# Altium footprint library Samtec.PcbLib: 8 footprints
Each footprint in its own frame and in the unit in brackets; x right, y up, seen from the top. Pads: shape width x height; smd on the part's side, far side on the other; paste and mask are expansions set on the pad; w line width, h text height; cw(c..) or ccw(c..) is an arc to the next point about the centre after c.
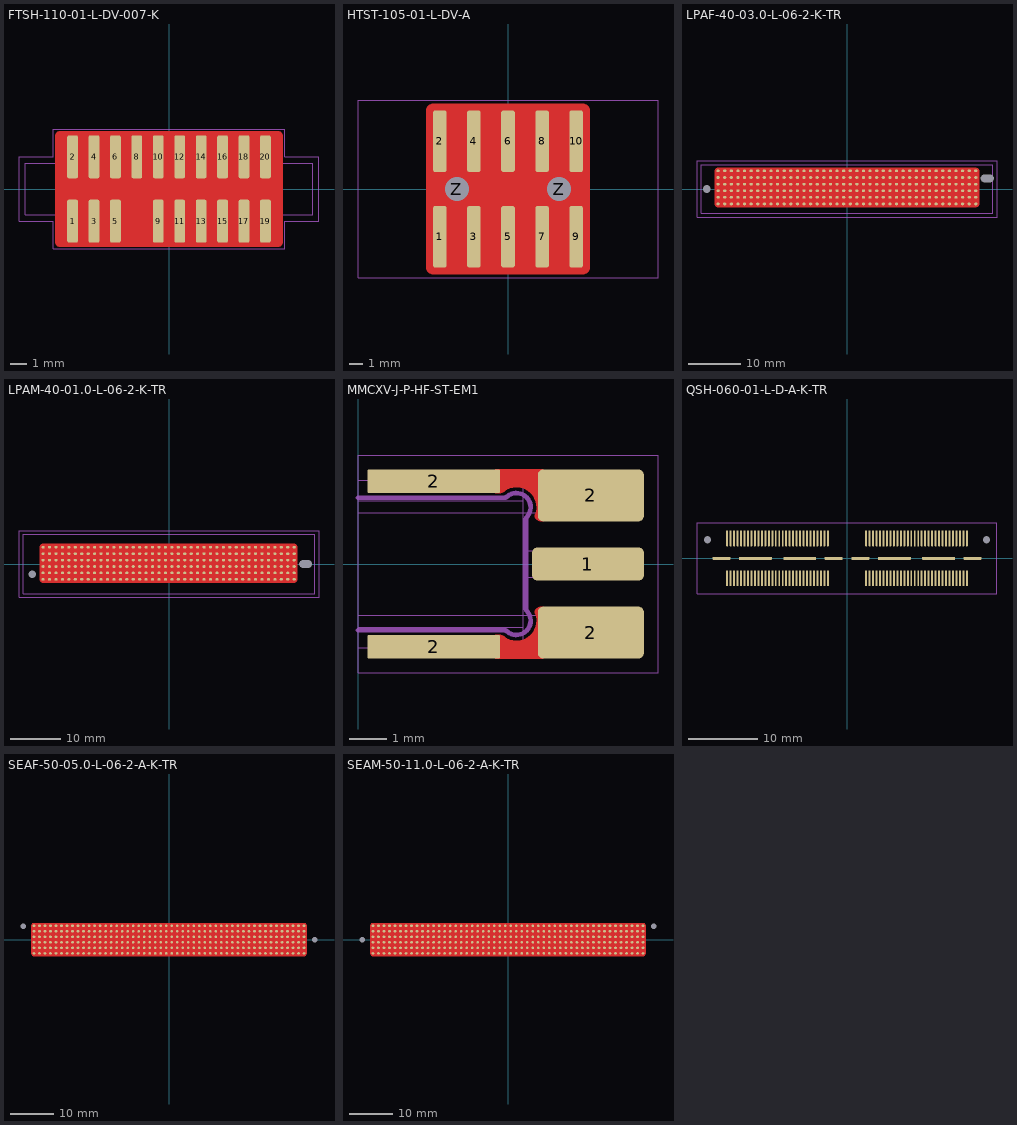
[diagram p0: the footprints below, top view; thin cyan lines are the x and y axes]

## FTSH-110-01-L-DV-007-K [mil]
pads (19):
  rrect30% 25x100 smd mask+2: 1(-225,-75) 2(-225,75) 3(-175,-75) 4(-175,75) 5(-125,-75) 6(-125,75) 8(-75,75) 9(-25,-75) 10(-25,75) 11(25,-75) 12(25,75) 13(75,-75) 14(75,75) 15(125,-75) 16(125,75) 17(175,-75) 18(175,75) 19(225,-75) 20(225,75)
Top Layer:
  pour cut-out: -255,135 -256.99,135 -260.66,133.48 -263.48,130.66 -265,126.99 -265,125 -265,-125 -265,-126.99 -263.48,-130.66 -260.66,-133.48 -256.99,-135 -255,-135 255,-135 256.99,-135 260.66,-133.48 263.48,-130.66 265,-126.99 265,-125 265,125 265,126.99 263.48,130.66 260.66,133.48 256.99,135 255,135
Mechanical 15:
  lines w1: -350,-75 -350,75 -270,75 -270,140 270,140 270,75 350,75 350,-75 270,-75 270,-140 -270,-140 -270,-75 -350,-75
Mechanical 16:
  lines w1: -335,-60 -335,60 335,60 335,-60 -335,-60
3D body "FTSH-110-01-L-DV-007-K.step": height 240, standoff -1, extent -249.99,-114.99 250.01,115

## HTST-105-01-L-DV-A [mil]
pads (12):
  rrect30% 40x180 smd mask+2: 1(-200,-140) 2(-200,140) 3(-100,-140) 4(-100,140) 5(0,-140) 6(0,140) 7(100,-140) 8(100,140) 9(200,-140) 10(200,140)
  round 65 hole 70 unplated mask+8: Z(-150,0) Z(150,0)
Top Layer:
  pour cut-out: -240,-230 -240,-233.98 -236.96,-241.33 -231.33,-246.96 -223.98,-250 -220,-250 220,-250 223.98,-250 231.33,-246.96 236.96,-241.33 240,-233.98 240,-230 240,230 240,233.98 236.96,241.33 231.33,246.96 223.98,250 220,250 -220,250 -223.98,250 -231.33,246.96 -236.96,241.33 -240,233.98 -240,230
Mechanical 15:
  lines w1: -440,-260 440,-260 440,260 -440,260 -440,-260
Multi-Layer:
  pour cut-out: 150,45 154.43,45 163.13,43.27 171.32,39.88 178.69,34.95 184.95,28.69 189.88,21.32 193.27,13.13 195,4.43 195,0 195,-4.43 193.27,-13.13 189.88,-21.32 184.95,-28.69 178.69,-34.95 171.32,-39.88 163.13,-43.27 154.43,-45 150,-45 145.57,-45 136.87,-43.27 128.68,-39.88 121.31,-34.95 115.05,-28.69 110.12,-21.32 106.73,-13.13 105,-4.43 105,0 105,4.43 106.73,13.13 110.12,21.32 115.05,28.69 121.31,34.95 128.68,39.88 136.87,43.27 145.57,45
  pour cut-out: -150,45 -145.57,45 -136.87,43.27 -128.68,39.88 -121.31,34.95 -115.05,28.69 -110.12,21.32 -106.73,13.13 -105,4.43 -105,0 -105,-4.43 -106.73,-13.13 -110.12,-21.32 -115.05,-28.69 -121.31,-34.95 -128.68,-39.88 -136.87,-43.27 -145.57,-45 -150,-45 -154.43,-45 -163.13,-43.27 -171.32,-39.88 -178.69,-34.95 -184.95,-28.69 -189.88,-21.32 -193.27,-13.13 -195,-4.43 -195,0 -195,4.43 -193.27,13.13 -189.88,21.32 -184.95,28.69 -178.69,34.95 -171.32,39.88 -163.13,43.27 -154.43,45
3D body "HTST-105-01-L-DV-A.step": height 400, standoff -20, extent -399.99,-219.99 400.01,220.01

## LPAF-40-03.0-L-06-2-K-TR [mil]
pads (242):
  oval 25x20 smd paste+3.5 mask+2: A1(-975.3,137) A2(-925.3,137) A3(-875.3,137) A4(-825.3,137) A5(-775.3,137) A6(-725.3,137) A7(-675.3,137) A8(-625.3,137) A9(-575.3,137) A10(-525.3,137) A11(-475.3,137) A12(-425.3,137) A13(-375.3,137) A14(-325.3,137) A15(-275.3,137) A16(-225.3,137) A17(-175.3,137) A18(-125.3,137) A19(-75.3,137) A20(-25.3,137) A21(24.7,137) A22(74.7,137) A23(124.7,137) A24(174.7,137) A25(224.7,137) A26(274.7,137) A27(324.7,137) A28(374.7,137) A29(424.7,137) A30(474.7,137) A31(524.7,137) A32(574.7,137) A33(624.7,137) A34(674.7,137) A35(724.7,137) A36(774.7,137) A37(824.7,137) A38(874.7,137) A39(924.7,137) A40(974.7,137) B1(-975.3,87) B2(-925.3,87) B3(-875.3,87) B4(-825.3,87) B5(-775.3,87) B6(-725.3,87) B7(-675.3,87) B8(-625.3,87) B9(-575.3,87) B10(-525.3,87) B11(-475.3,87) B12(-425.3,87) B13(-375.3,87) B14(-325.3,87) B15(-275.3,87) B16(-225.3,87) B17(-175.3,87) B18(-125.3,87) B19(-75.3,87) B20(-25.3,87) B21(24.7,87) B22(74.7,87) B23(124.7,87) B24(174.7,87) B25(224.7,87) B26(274.7,87) B27(324.7,87) B28(374.7,87) B29(424.7,87) B30(474.7,87) B31(524.7,87) B32(574.7,87) B33(624.7,87) B34(674.7,87) B35(724.7,87) B36(774.7,87) B37(824.7,87) B38(874.7,87) B39(924.7,87) B40(974.7,87) C1(-975.3,37) C2(-925.3,37) C3(-875.3,37) C4(-825.3,37) C5(-775.3,37) C6(-725.3,37) C7(-675.3,37) C8(-625.3,37) C9(-575.3,37) C10(-525.3,37) C11(-475.3,37) C12(-425.3,37) C13(-375.3,37) C14(-325.3,37) C15(-275.3,37) C16(-225.3,37) C17(-175.3,37) C18(-125.3,37) C19(-75.3,37) C20(-25.3,37) C21(24.7,37) C22(74.7,37) C23(124.7,37) C24(174.7,37) C25(224.7,37) C26(274.7,37) C27(324.7,37) C28(374.7,37) C29(424.7,37) C30(474.7,37) C31(524.7,37) C32(574.7,37) C33(624.7,37) C34(674.7,37) C35(724.7,37) C36(774.7,37) C37(824.7,37) C38(874.7,37) C39(924.7,37) C40(974.7,37) D1(-975.3,-13) D2(-925.3,-13) D3(-875.3,-13) D4(-825.3,-13) D5(-775.3,-13) D6(-725.3,-13) D7(-675.3,-13) D8(-625.3,-13) D9(-575.3,-13) D10(-525.3,-13) D11(-475.3,-13) D12(-425.3,-13) D13(-375.3,-13) D14(-325.3,-13) D15(-275.3,-13) D16(-225.3,-13) D17(-175.3,-13) D18(-125.3,-13) D19(-75.3,-13) D20(-25.3,-13) D21(24.7,-13) D22(74.7,-13) D23(124.7,-13) D24(174.7,-13) D25(224.7,-13) D26(274.7,-13) D27(324.7,-13) D28(374.7,-13) D29(424.7,-13) D30(474.7,-13) D31(524.7,-13) D32(574.7,-13) D33(624.7,-13) D34(674.7,-13) D35(724.7,-13) D36(774.7,-13) D37(824.7,-13) D38(874.7,-13) D39(924.7,-13) D40(974.7,-13) E1(-975.3,-63) E2(-925.3,-63) E3(-875.3,-63) E4(-825.3,-63) E5(-775.3,-63) E6(-725.3,-63) E7(-675.3,-63) E8(-625.3,-63) E9(-575.3,-63) E10(-525.3,-63) E11(-475.3,-63) E12(-425.3,-63) E13(-375.3,-63) E14(-325.3,-63) E15(-275.3,-63) E16(-225.3,-63) E17(-175.3,-63) E18(-125.3,-63) E19(-75.3,-63) E20(-25.3,-63) E21(24.7,-63) E22(74.7,-63) E23(124.7,-63) E24(174.7,-63) E25(224.7,-63) E26(274.7,-63) E27(324.7,-63) E28(374.7,-63) E29(424.7,-63) E30(474.7,-63) E31(524.7,-63) E32(574.7,-63) E33(624.7,-63) E34(674.7,-63) E35(724.7,-63) E36(774.7,-63) E37(824.7,-63) E38(874.7,-63) E39(924.7,-63) E40(974.7,-63) F1(-975.3,-113) F2(-925.3,-113) F3(-875.3,-113) F4(-825.3,-113) F5(-775.3,-113) F6(-725.3,-113) F7(-675.3,-113) F8(-625.3,-113) F9(-575.3,-113) F10(-525.3,-113) F11(-475.3,-113) F12(-425.3,-113) F13(-375.3,-113) F14(-325.3,-113) F15(-275.3,-113) F16(-225.3,-113) F17(-175.3,-113) F18(-125.3,-113) F19(-75.3,-113) F20(-25.3,-113) F21(24.7,-113) F22(74.7,-113) F23(124.7,-113) F24(174.7,-113) F25(224.7,-113) F26(274.7,-113) F27(324.7,-113) F28(374.7,-113) F29(424.7,-113) F30(474.7,-113) F31(524.7,-113) F32(574.7,-113) F33(624.7,-113) F34(674.7,-113) F35(724.7,-113) F36(774.7,-113) F37(824.7,-113) F38(874.7,-113) F39(924.7,-113) F40(974.7,-113)
  round 25 hole 57 unplated: B(-1061,0)
  round 25 hole 57 slot 97 at 0 deg unplated: B(1061,80)
Top Layer:
  pour cut-out: -975.3,162 -980.27,162 -989.46,158.19 -996.49,151.16 -1000.3,141.97 -1000.3,137 -1000.3,-113 -1000.3,-117.97 -996.49,-127.16 -989.46,-134.19 -980.27,-138 -975.3,-138 974.7,-138 979.67,-138 988.86,-134.19 995.89,-127.16 999.7,-117.97 999.7,-113 999.7,137 999.7,141.97 995.89,151.16 988.86,158.19 979.67,162 974.7,162
Top Solder:
  region: -1010,135 -1040,120 -1040,150
Mechanical 15:
  lines w1: -1135,-215 1135,-215 1135,215 -1135,215 -1135,-215
Mechanical 16:
  lines w1: -1102,-182 1102,-182 1102,182 -1102,182 -1102,-182
3D body "LPAF-40-03.0-L-06-2-K-TR.stp": height 112.5, standoff -52.5, extent -1102,-182 1102,182

## LPAM-40-01.0-L-06-2-K-TR [mil]
pads (242):
  oval 25x20 smd paste+3.5 mask+2: A1(-977.8,-119.5) A2(-927.8,-119.5) A3(-877.8,-119.5) A4(-827.8,-119.5) A5(-777.8,-119.5) A6(-727.8,-119.5) A7(-677.8,-119.5) A8(-627.8,-119.5) A9(-577.8,-119.5) A10(-527.8,-119.5) A11(-477.8,-119.5) A12(-427.8,-119.5) A13(-377.8,-119.5) A14(-327.8,-119.5) A15(-277.8,-119.5) A16(-227.8,-119.5) A17(-177.8,-119.5) A18(-127.8,-119.5) A19(-77.8,-119.5) A20(-27.8,-119.5) A21(22.2,-119.5) A22(72.2,-119.5) A23(122.2,-119.5) A24(172.2,-119.5) A25(222.2,-119.5) A26(272.2,-119.5) A27(322.2,-119.5) A28(372.2,-119.5) A29(422.2,-119.5) A30(472.2,-119.5) A31(522.2,-119.5) A32(572.2,-119.5) A33(622.2,-119.5) A34(672.2,-119.5) A35(722.2,-119.5) A36(772.2,-119.5) A37(822.2,-119.5) A38(872.2,-119.5) A39(922.2,-119.5) A40(972.2,-119.5) B1(-977.8,-69.5) B2(-927.8,-69.5) B3(-877.8,-69.5) B4(-827.8,-69.5) B5(-777.8,-69.5) B6(-727.8,-69.5) B7(-677.8,-69.5) B8(-627.8,-69.5) B9(-577.8,-69.5) B10(-527.8,-69.5) B11(-477.8,-69.5) B12(-427.8,-69.5) B13(-377.8,-69.5) B14(-327.8,-69.5) B15(-277.8,-69.5) B16(-227.8,-69.5) B17(-177.8,-69.5) B18(-127.8,-69.5) B19(-77.8,-69.5) B20(-27.8,-69.5) B21(22.2,-69.5) B22(72.2,-69.5) B23(122.2,-69.5) B24(172.2,-69.5) B25(222.2,-69.5) B26(272.2,-69.5) B27(322.2,-69.5) B28(372.2,-69.5) B29(422.2,-69.5) B30(472.2,-69.5) B31(522.2,-69.5) B32(572.2,-69.5) B33(622.2,-69.5) B34(672.2,-69.5) B35(722.2,-69.5) B36(772.2,-69.5) B37(822.2,-69.5) B38(872.2,-69.5) B39(922.2,-69.5) B40(972.2,-69.5) C1(-977.8,-19.5) C2(-927.8,-19.5) C3(-877.8,-19.5) C4(-827.8,-19.5) C5(-777.8,-19.5) C6(-727.8,-19.5) C7(-677.8,-19.5) C8(-627.8,-19.5) C9(-577.8,-19.5) C10(-527.8,-19.5) C11(-477.8,-19.5) C12(-427.8,-19.5) C13(-377.8,-19.5) C14(-327.8,-19.5) C15(-277.8,-19.5) C16(-227.8,-19.5) C17(-177.8,-19.5) C18(-127.8,-19.5) C19(-77.8,-19.5) C20(-27.8,-19.5) C21(22.2,-19.5) C22(72.2,-19.5) C23(122.2,-19.5) C24(172.2,-19.5) C25(222.2,-19.5) C26(272.2,-19.5) C27(322.2,-19.5) C28(372.2,-19.5) C29(422.2,-19.5) C30(472.2,-19.5) C31(522.2,-19.5) C32(572.2,-19.5) C33(622.2,-19.5) C34(672.2,-19.5) C35(722.2,-19.5) C36(772.2,-19.5) C37(822.2,-19.5) C38(872.2,-19.5) C39(922.2,-19.5) C40(972.2,-19.5) D1(-977.8,30.5) D2(-927.8,30.5) D3(-877.8,30.5) D4(-827.8,30.5) D5(-777.8,30.5) D6(-727.8,30.5) D7(-677.8,30.5) D8(-627.8,30.5) D9(-577.8,30.5) D10(-527.8,30.5) D11(-477.8,30.5) D12(-427.8,30.5) D13(-377.8,30.5) D14(-327.8,30.5) D15(-277.8,30.5) D16(-227.8,30.5) D17(-177.8,30.5) D18(-127.8,30.5) D19(-77.8,30.5) D20(-27.8,30.5) D21(22.2,30.5) D22(72.2,30.5) D23(122.2,30.5) D24(172.2,30.5) D25(222.2,30.5) D26(272.2,30.5) D27(322.2,30.5) D28(372.2,30.5) D29(422.2,30.5) D30(472.2,30.5) D31(522.2,30.5) D32(572.2,30.5) D33(622.2,30.5) D34(672.2,30.5) D35(722.2,30.5) D36(772.2,30.5) D37(822.2,30.5) D38(872.2,30.5) D39(922.2,30.5) D40(972.2,30.5) E1(-977.8,80.5) E2(-927.8,80.5) E3(-877.8,80.5) E4(-827.8,80.5) E5(-777.8,80.5) E6(-727.8,80.5) E7(-677.8,80.5) E8(-627.8,80.5) E9(-577.8,80.5) E10(-527.8,80.5) E11(-477.8,80.5) E12(-427.8,80.5) E13(-377.8,80.5) E14(-327.8,80.5) E15(-277.8,80.5) E16(-227.8,80.5) E17(-177.8,80.5) E18(-127.8,80.5) E19(-77.8,80.5) E20(-27.8,80.5) E21(22.2,80.5) E22(72.2,80.5) E23(122.2,80.5) E24(172.2,80.5) E25(222.2,80.5) E26(272.2,80.5) E27(322.2,80.5) E28(372.2,80.5) E29(422.2,80.5) E30(472.2,80.5) E31(522.2,80.5) E32(572.2,80.5) E33(622.2,80.5) E34(672.2,80.5) E35(722.2,80.5) E36(772.2,80.5) E37(822.2,80.5) E38(872.2,80.5) E39(922.2,80.5) E40(972.2,80.5) F1(-977.8,130.5) F2(-927.8,130.5) F3(-877.8,130.5) F4(-827.8,130.5) F5(-777.8,130.5) F6(-727.8,130.5) F7(-677.8,130.5) F8(-627.8,130.5) F9(-577.8,130.5) F10(-527.8,130.5) F11(-477.8,130.5) F12(-427.8,130.5) F13(-377.8,130.5) F14(-327.8,130.5) F15(-277.8,130.5) F16(-227.8,130.5) F17(-177.8,130.5) F18(-127.8,130.5) F19(-77.8,130.5) F20(-27.8,130.5) F21(22.2,130.5) F22(72.2,130.5) F23(122.2,130.5) F24(172.2,130.5) F25(222.2,130.5) F26(272.2,130.5) F27(322.2,130.5) F28(372.2,130.5) F29(422.2,130.5) F30(472.2,130.5) F31(522.2,130.5) F32(572.2,130.5) F33(622.2,130.5) F34(672.2,130.5) F35(722.2,130.5) F36(772.2,130.5) F37(822.2,130.5) F38(872.2,130.5) F39(922.2,130.5) F40(972.2,130.5)
  round 25 hole 57 unplated: B(-1061,-80)
  round 25 hole 57 slot 97 at 0 deg unplated: B(1061,0)
Top Layer:
  pour cut-out: -977.8,155.5 -982.77,155.5 -991.96,151.69 -998.99,144.66 -1002.8,135.47 -1002.8,130.5 -1002.8,-119.5 -1002.8,-124.47 -998.99,-133.66 -991.96,-140.69 -982.77,-144.5 -977.8,-144.5 972.2,-144.5 977.17,-144.5 986.36,-140.69 993.39,-133.66 997.2,-124.47 997.2,-119.5 997.2,130.5 997.2,135.47 993.39,144.66 986.36,151.69 977.17,155.5 972.2,155.5
Top Solder:
  region: -930,-155 -915,-185 -945,-185
Mechanical 15:
  lines w1: -1165,-260 1165,-260 1165,260 -1165,260 -1165,-260
Mechanical 16:
  lines w1: -1133,-230 -1133,230 1133,230 1133,-230 -1133,-230
3D body "LPAM-40-01.0-L-06-2-K-TR.stp": height 147.5, standoff -52.5, extent -1133,-230 1133,230

## MMCXV-J-P-HF-ST-EM1 [mil]
pads (5):
  rrect30% 118x35 smd mask+2: 1(243,0)
  rrect10% 140x25 smd mask+2: 2(80,-87.5) 2(80,87.5)
  rrect20% 112x55 smd mask+2: 2(246,-72.5) 2(246,72.5)
Top Layer:
  region: 145,-75 150.17,-75 150.84,-75 152.16,-75.26 153.41,-75.78 154.52,-76.52 155,-77 157.05,-79.05 158.28,-80.16 161.03,-82 164.09,-83.27 167.34,-83.92 169,-84 170.42,-83.93 173.2,-83.38 175.83,-82.29 178.19,-80.71 179.24,-79.76 182.93,-76.07 184.29,-74.56 186.55,-71.19 188.11,-67.43 188.9,-63.45 189,-61.41 189,-50.41 188.98,-50.08 188.85,-49.42 188.6,-48.8 188.22,-48.25 188,-48 188.88,-47.12 189.38,-46.62 190.57,-45.82 191.89,-45.28 193.29,-45 194,-45 196,-45 196,-100 145,-100
  region: 145,75 150.17,75 150.84,75 152.16,75.26 153.41,75.78 154.52,76.52 155,77 157.05,79.05 158.28,80.16 161.03,82 164.09,83.27 167.34,83.92 169,84 170.42,83.93 173.2,83.38 175.83,82.29 178.19,80.71 179.24,79.76 182.93,76.07 184.29,74.56 186.55,71.19 188.11,67.43 188.9,63.45 189,61.41 189,50.41 188.98,50.08 188.85,49.42 188.6,48.8 188.22,48.25 188,48 188.88,47.12 189.38,46.62 190.57,45.82 191.89,45.28 193.29,45 194,45 196,45 196,100 145,100
  lines w10: 150.92,-80.1 ccw(c167.41,-60) 191.7,-50.73 ; 150.92,80.1 cw(c167.41,60) 191.7,50.73
Mechanical 15:
  lines w1: 0,-70 0,-115 317,-115 317,115 0,115 0,70
  lines w5: 0,-70 154.17,-70 cw(c154.17,-75.09) 157.77,-71.49 ccw(c167.41,-60) 178.9,-50.36 cw(c182.5,-46.76) 177.41,-46.76 177.41,46.76 cw(c182.5,46.76) 178.9,50.36 ccw(c167.41,60) 157.77,71.49 cw(c154.17,75.09) 154.17,70 0,70
Mechanical 16:
  lines w1: 0,-67 174.41,-67 ; 0,-54.13 292.91,-54.13 292.91,-88.58 0,-88.58 0,88.58 292.91,88.58 292.91,54.13 0,54.13 ; 0,67 174.41,67 ; 174.41,-88.58 174.41,88.58 ; 174.41,-14 292.91,-14 292.91,14 174.41,14
3D body "SAMTEC-MMCXV-J-P-HF-ST-EM1.stp": height 82.9, standoff -54.9, extent 1.58,-88.58 292.91,88.58

## QSH-060-01-L-D-A-K-TR [mil] "CONN,SM,2X60,120POS,0.50MM HI-SPEED SOCKET QSH SERIES,H=.128IN"
pads (130):
  rrect30% 11x89.5 smd mask+1.5: 1(-679.18,-112.8) 2(-679.18,112.8) 3(-659.5,-112.8) 4(-659.5,112.8) 5(-639.81,-112.8) 6(-639.81,112.8) 7(-620.13,-112.8) 8(-620.13,112.8) 9(-600.44,-112.8) 10(-600.44,112.8) 11(-580.76,-112.8) 12(-580.76,112.8) 13(-561.07,-112.8) 14(-561.07,112.8) 15(-541.39,-112.8) 16(-541.39,112.8) 17(-521.7,-112.8) 18(-521.7,112.8) 19(-502.02,-112.8) 20(-502.02,112.8) 21(-482.33,-112.8) 22(-482.33,112.8) 23(-462.65,-112.8) 24(-462.65,112.8) 25(-442.96,-112.8) 26(-442.96,112.8) 27(-423.28,-112.8) 28(-423.28,112.8) 29(-403.59,-112.8) 30(-403.59,112.8) 31(-383.91,-112.8) 32(-383.91,112.8) 33(-364.22,-112.8) 34(-364.22,112.8) 35(-344.54,-112.8) 36(-344.54,112.8) 37(-324.85,-112.8) 38(-324.85,112.8) 39(-305.17,-112.8) 40(-305.17,112.8) 41(-285.48,-112.8) 42(-285.48,112.8) 43(-265.8,-112.8) 44(-265.8,112.8) 45(-246.11,-112.8) 46(-246.11,112.8) 47(-226.43,-112.8) 48(-226.43,112.8) 49(-206.74,-112.8) 50(-206.74,112.8) 51(-187.06,-112.8) 52(-187.06,112.8) 53(-167.37,-112.8) 54(-167.37,112.8) 55(-147.69,-112.8) 56(-147.69,112.8) 57(-128,-112.8) 58(-128,112.8) 59(-108.32,-112.8) 60(-108.32,112.8) 61(108.32,-112.8) 62(108.32,112.8)
  rrect30% 11x89.5 smd paste+0 mask+1.5: 63(128,-112.8) 64(128,112.8) 65(147.69,-112.8) 66(147.69,112.8) 67(167.37,-112.8) 68(167.37,112.8) 69(187.06,-112.8) 70(187.06,112.8) 71(206.74,-112.8) 72(206.74,112.8) 73(226.43,-112.8) 74(226.43,112.8) 75(246.11,-112.8) 76(246.11,112.8) 77(265.8,-112.8) 78(265.8,112.8) 79(285.48,-112.8) 80(285.48,112.8) 81(305.17,-112.8) 82(305.17,112.8) 83(324.85,-112.8) 84(324.85,112.8) 85(344.54,-112.8) 86(344.54,112.8) 87(364.22,-112.8) 88(364.22,112.8) 89(383.91,-112.8) 90(383.91,112.8) 91(403.59,-112.8) 92(403.59,112.8) 93(423.28,-112.8) 94(423.28,112.8) 95(442.96,-112.8) 96(442.96,112.8) 97(462.65,-112.8) 98(462.65,112.8) 99(482.33,-112.8) 100(482.33,112.8) 101(502.02,-112.8) 102(502.02,112.8) 103(521.7,-112.8) 104(521.7,112.8) 105(541.39,-112.8) 106(541.39,112.8) 107(561.07,-112.8) 108(561.07,112.8) 109(580.76,-112.8) 110(580.76,112.8) 111(600.44,-112.8) 112(600.44,112.8) 113(620.13,-112.8) 114(620.13,112.8) 115(639.81,-112.8) 116(639.81,112.8) 117(659.5,-112.8) 118(659.5,112.8) 119(679.18,-112.8) 120(679.18,112.8)
  rrect15% 100x17 smd mask+1.5: P(-711.25,0) P(-76.25,0) P(76.25,0) P(711.25,0)
  rrect15% 185x17 smd mask+1.5: P(-518.75,0) P(-268.75,0) P(268.75,0) P(518.75,0)
  round 28 hole 40 unplated mask+8: Z(-789.88,105) Z(790.88,105)
Mechanical 15:
  lines w1: -850,-200 850,-200 850,200 -850,200 -850,-200
Multi-Layer:
  pour cut-out: -10,-265
  pour cut-out: 790.88,135 793.84,135 799.63,133.85 805.09,131.59 810.01,128.3 814.19,124.12 817.47,119.21 819.73,113.75 820.88,107.95 820.88,105 820.88,102.05 819.73,96.25 817.47,90.79 814.19,85.88 810.01,81.7 805.09,78.41 799.63,76.15 793.84,75 790.88,75 787.93,75 782.13,76.15 776.67,78.41 771.76,81.7 767.58,85.88 764.3,90.79 762.04,96.25 760.88,102.05 760.88,105 760.88,107.95 762.04,113.75 764.3,119.21 767.58,124.12 771.76,128.3 776.67,131.59 782.13,133.85 787.93,135
  pour cut-out: -789.88,135 -786.93,135 -781.13,133.85 -775.67,131.59 -770.76,128.3 -766.58,124.12 -763.3,119.21 -761.04,113.75 -759.88,107.95 -759.88,105 -759.88,102.05 -761.04,96.25 -763.3,90.79 -766.58,85.88 -770.76,81.7 -775.67,78.41 -781.13,76.15 -786.93,75 -789.88,75 -792.84,75 -798.63,76.15 -804.09,78.41 -809.01,81.7 -813.19,85.88 -816.47,90.79 -818.73,96.25 -819.88,102.05 -819.88,105 -819.88,107.95 -818.73,113.75 -816.47,119.21 -813.19,124.12 -809.01,128.3 -804.09,131.59 -798.63,133.85 -792.84,135
3D body "QSH-060-01-L-D-A-K-TR.stp": height 133, standoff -29.5, extent -812.75,-162.51 813.75,162.49

## SEAF-50-05.0-L-06-2-A-K-TR [mil]
height 250
pads (302):
  oval 25x20 smd: A1(-1225,125) A2(-1175,125) A3(-1125,125) A4(-1075,125) A5(-1025,125) A6(-975,125) A7(-925,125) A8(-875,125) A9(-825,125) A10(-775,125) A11(-725,125) A12(-675,125) A13(-625,125) A14(-575,125) A15(-525,125) A16(-475,125) A17(-425,125) A18(-375,125) A19(-325,125) A20(-275,125) A21(-225,125) A22(-175,125) A23(-125,125) A24(-75,125) A25(-25,125) A26(25,125) A27(75,125) A28(125,125) A29(175,125) A30(225,125) A31(275,125) A32(325,125) A33(375,125) A34(425,125) A35(475,125) A36(525,125) A37(575,125) A38(625,125) A39(675,125) A40(725,125) A41(775,125) A42(825,125) A43(875,125) A44(925,125) A45(975,125) A46(1025,125) A47(1075,125) A48(1125,125) A49(1175,125) A50(1225,125) B1(-1225,75) B2(-1175,75) B3(-1125,75) B4(-1075,75) B5(-1025,75) B6(-975,75) B7(-925,75) B8(-875,75) B9(-825,75) B10(-775,75) B11(-725,75) B12(-675,75) B13(-625,75) B14(-575,75) B15(-525,75) B16(-475,75) B17(-425,75) B18(-375,75) B19(-325,75) B20(-275,75) B21(-225,75) B22(-175,75) B23(-125,75) B24(-75,75) B25(-25,75) B26(25,75) B27(75,75) B28(125,75) B29(175,75) B30(225,75) B31(275,75) B32(325,75) B33(375,75) B34(425,75) B35(475,75) B36(525,75) B37(575,75) B38(625,75) B39(675,75) B40(725,75) B41(775,75) B42(825,75) B43(875,75) B44(925,75) B45(975,75) B46(1025,75) B47(1075,75) B48(1125,75) B49(1175,75) B50(1225,75) C1(-1225,25) C2(-1175,25) C3(-1125,25) C4(-1075,25) C5(-1025,25) C6(-975,25) C7(-925,25) C8(-875,25) C9(-825,25) C10(-775,25) C11(-725,25) C12(-675,25) C13(-625,25) C14(-575,25) C15(-525,25) C16(-475,25) C17(-425,25) C18(-375,25) C19(-325,25) C20(-275,25) C21(-225,25) C22(-175,25) C23(-125,25) C24(-75,25) C25(-25,25) C26(25,25) C27(75,25) C28(125,25) C29(175,25) C30(225,25) C31(275,25) C32(325,25) C33(375,25) C34(425,25) C35(475,25) C36(525,25) C37(575,25) C38(625,25) C39(675,25) C40(725,25) C41(775,25) C42(825,25) C43(875,25) C44(925,25) C45(975,25) C46(1025,25) C47(1075,25) C48(1125,25) C49(1175,25) C50(1225,25) D1(-1225,-25) D2(-1175,-25) D3(-1125,-25) D4(-1075,-25) D5(-1025,-25) D6(-975,-25) D7(-925,-25) D8(-875,-25) D9(-825,-25) D10(-775,-25) D11(-725,-25) D12(-675,-25) D13(-625,-25) D14(-575,-25) D15(-525,-25) D16(-475,-25) D17(-425,-25) D18(-375,-25) D19(-325,-25) D20(-275,-25) D21(-225,-25) D22(-175,-25) D23(-125,-25) D24(-75,-25) D25(-25,-25) D26(25,-25) D27(75,-25) D28(125,-25) D29(175,-25) D30(225,-25) D31(275,-25) D32(325,-25) D33(375,-25) D34(425,-25) D35(475,-25) D36(525,-25) D37(575,-25) D38(625,-25) D39(675,-25) D40(725,-25) D41(775,-25) D42(825,-25) D43(875,-25) D44(925,-25) D45(975,-25) D46(1025,-25) D47(1075,-25) D48(1125,-25) D49(1175,-25) D50(1225,-25) E1(-1225,-75) E2(-1175,-75) E3(-1125,-75) E4(-1075,-75) E5(-1025,-75) E6(-975,-75) E7(-925,-75) E8(-875,-75) E9(-825,-75) E10(-775,-75) E11(-725,-75) E12(-675,-75) E13(-625,-75) E14(-575,-75) E15(-525,-75) E16(-475,-75) E17(-425,-75) E18(-375,-75) E19(-325,-75) E20(-275,-75) E21(-225,-75) E22(-175,-75) E23(-125,-75) E24(-75,-75) E25(-25,-75) E26(25,-75) E27(75,-75) E28(125,-75) E29(175,-75) E30(225,-75) E31(275,-75) E32(325,-75) E33(375,-75) E34(425,-75) E35(475,-75) E36(525,-75) E37(575,-75) E38(625,-75) E39(675,-75) E40(725,-75) E41(775,-75) E42(825,-75) E43(875,-75) E44(925,-75) E45(975,-75) E46(1025,-75) E47(1075,-75) E48(1125,-75) E49(1175,-75) E50(1225,-75) F1(-1225,-125) F2(-1175,-125) F3(-1125,-125) F4(-1075,-125) F5(-1025,-125) F6(-975,-125) F7(-925,-125) F8(-875,-125) F9(-825,-125) F10(-775,-125) F11(-725,-125) F12(-675,-125) F13(-625,-125) F14(-575,-125) F15(-525,-125) F16(-475,-125) F17(-425,-125) F18(-375,-125) F19(-325,-125) F20(-275,-125) F21(-225,-125) F22(-175,-125) F23(-125,-125) F24(-75,-125) F25(-25,-125) F26(25,-125) F27(75,-125) F28(125,-125) F29(175,-125) F30(225,-125) F31(275,-125) F32(325,-125) F33(375,-125) F34(425,-125) F35(475,-125) F36(525,-125) F37(575,-125) F38(625,-125) F39(675,-125) F40(725,-125) F41(775,-125) F42(825,-125) F43(875,-125) F44(925,-125) F45(975,-125) F46(1025,-125) F47(1075,-125) F48(1125,-125) F49(1175,-125) F50(1225,-125)
  round 40 hole 50 unplated mask+8: Z(-1320.5,120) Z(1320.5,0)
Top Layer:
  pour cut-out: -1225,150 -1229.97,150 -1239.16,146.19 -1246.19,139.16 -1250,129.97 -1250,125 -1250,-125 -1250,-129.97 -1246.19,-139.16 -1239.16,-146.19 -1229.97,-150 -1225,-150 1225,-150 1229.97,-150 1239.16,-146.19 1246.19,-139.16 1250,-129.97 1250,-125 1250,125 1250,129.97 1246.19,139.16 1239.16,146.19 1229.97,150 1225,150
Multi-Layer:
  pour cut-out: 1320.5,40 1316.56,40 1308.83,38.46 1301.55,35.45 1295,31.07 1289.43,25.5 1285.05,18.95 1282.04,11.67 1280.5,3.94 1280.5,0 1280.5,-3.94 1282.04,-11.67 1285.05,-18.95 1289.43,-25.5 1295,-31.07 1301.55,-35.45 1308.83,-38.46 1316.56,-40 1320.5,-40 1324.44,-40 1332.17,-38.46 1339.45,-35.45 1346,-31.07 1351.57,-25.5 1355.95,-18.95 1358.96,-11.67 1360.5,-3.94 1360.5,0 1360.5,3.94 1358.96,11.67 1355.95,18.95 1351.57,25.5 1346,31.07 1339.45,35.45 1332.17,38.46 1324.44,40
  pour cut-out: -1320.5,160 -1316.56,160 -1308.83,158.46 -1301.55,155.45 -1295,151.07 -1289.43,145.5 -1285.05,138.95 -1282.04,131.67 -1280.5,123.94 -1280.5,120 -1280.5,116.06 -1282.04,108.33 -1285.05,101.05 -1289.43,94.5 -1295,88.93 -1301.55,84.55 -1308.83,81.54 -1316.56,80 -1320.5,80 -1324.44,80 -1332.17,81.54 -1339.45,84.55 -1346,88.93 -1351.57,94.5 -1355.95,101.05 -1358.96,108.33 -1360.5,116.06 -1360.5,120 -1360.5,123.94 -1358.96,131.67 -1355.95,138.95 -1351.57,145.5 -1346,151.07 -1339.45,155.45 -1332.17,158.46 -1324.44,160
3D body "SEAF-50-05.0-L-06-2-A-K-TR.stp": height 197, standoff -52, extent -1381,-161.5 1381,161.5

## SEAM-50-11.0-L-06-2-A-K-TR [mil]
height 250
pads (302):
  oval 25x20 smd: A1(-1225,-125) A2(-1175,-125) A3(-1125,-125) A4(-1075,-125) A5(-1025,-125) A6(-975,-125) A7(-925,-125) A8(-875,-125) A9(-825,-125) A10(-775,-125) A11(-725,-125) A12(-675,-125) A13(-625,-125) A14(-575,-125) A15(-525,-125) A16(-475,-125) A17(-425,-125) A18(-375,-125) A19(-325,-125) A20(-275,-125) A21(-225,-125) A22(-175,-125) A23(-125,-125) A24(-75,-125) A25(-25,-125) A26(25,-125) A27(75,-125) A28(125,-125) A29(175,-125) A30(225,-125) A31(275,-125) A32(325,-125) A33(375,-125) A34(425,-125) A35(475,-125) A36(525,-125) A37(575,-125) A38(625,-125) A39(675,-125) A40(725,-125) A41(775,-125) A42(825,-125) A43(875,-125) A44(925,-125) A45(975,-125) A46(1025,-125) A47(1075,-125) A48(1125,-125) A49(1175,-125) A50(1225,-125) B1(-1225,-75) B2(-1175,-75) B3(-1125,-75) B4(-1075,-75) B5(-1025,-75) B6(-975,-75) B7(-925,-75) B8(-875,-75) B9(-825,-75) B10(-775,-75) B11(-725,-75) B12(-675,-75) B13(-625,-75) B14(-575,-75) B15(-525,-75) B16(-475,-75) B17(-425,-75) B18(-375,-75) B19(-325,-75) B20(-275,-75) B21(-225,-75) B22(-175,-75) B23(-125,-75) B24(-75,-75) B25(-25,-75) B26(25,-75) B27(75,-75) B28(125,-75) B29(175,-75) B30(225,-75) B31(275,-75) B32(325,-75) B33(375,-75) B34(425,-75) B35(475,-75) B36(525,-75) B37(575,-75) B38(625,-75) B39(675,-75) B40(725,-75) B41(775,-75) B42(825,-75) B43(875,-75) B44(925,-75) B45(975,-75) B46(1025,-75) B47(1075,-75) B48(1125,-75) B49(1175,-75) B50(1225,-75) C1(-1225,-25) C2(-1175,-25) C3(-1125,-25) C4(-1075,-25) C5(-1025,-25) C6(-975,-25) C7(-925,-25) C8(-875,-25) C9(-825,-25) C10(-775,-25) C11(-725,-25) C12(-675,-25) C13(-625,-25) C14(-575,-25) C15(-525,-25) C16(-475,-25) C17(-425,-25) C18(-375,-25) C19(-325,-25) C20(-275,-25) C21(-225,-25) C22(-175,-25) C23(-125,-25) C24(-75,-25) C25(-25,-25) C26(25,-25) C27(75,-25) C28(125,-25) C29(175,-25) C30(225,-25) C31(275,-25) C32(325,-25) C33(375,-25) C34(425,-25) C35(475,-25) C36(525,-25) C37(575,-25) C38(625,-25) C39(675,-25) C40(725,-25) C41(775,-25) C42(825,-25) C43(875,-25) C44(925,-25) C45(975,-25) C46(1025,-25) C47(1075,-25) C48(1125,-25) C49(1175,-25) C50(1225,-25) D1(-1225,25) D2(-1175,25) D3(-1125,25) D4(-1075,25) D5(-1025,25) D6(-975,25) D7(-925,25) D8(-875,25) D9(-825,25) D10(-775,25) D11(-725,25) D12(-675,25) D13(-625,25) D14(-575,25) D15(-525,25) D16(-475,25) D17(-425,25) D18(-375,25) D19(-325,25) D20(-275,25) D21(-225,25) D22(-175,25) D23(-125,25) D24(-75,25) D25(-25,25) D26(25,25) D27(75,25) D28(125,25) D29(175,25) D30(225,25) D31(275,25) D32(325,25) D33(375,25) D34(425,25) D35(475,25) D36(525,25) D37(575,25) D38(625,25) D39(675,25) D40(725,25) D41(775,25) D42(825,25) D43(875,25) D44(925,25) D45(975,25) D46(1025,25) D47(1075,25) D48(1125,25) D49(1175,25) D50(1225,25) E1(-1225,75) E2(-1175,75) E3(-1125,75) E4(-1075,75) E5(-1025,75) E6(-975,75) E7(-925,75) E8(-875,75) E9(-825,75) E10(-775,75) E11(-725,75) E12(-675,75) E13(-625,75) E14(-575,75) E15(-525,75) E16(-475,75) E17(-425,75) E18(-375,75) E19(-325,75) E20(-275,75) E21(-225,75) E22(-175,75) E23(-125,75) E24(-75,75) E25(-25,75) E26(25,75) E27(75,75) E28(125,75) E29(175,75) E30(225,75) E31(275,75) E32(325,75) E33(375,75) E34(425,75) E35(475,75) E36(525,75) E37(575,75) E38(625,75) E39(675,75) E40(725,75) E41(775,75) E42(825,75) E43(875,75) E44(925,75) E45(975,75) E46(1025,75) E47(1075,75) E48(1125,75) E49(1175,75) E50(1225,75) F1(-1225,125) F2(-1175,125) F3(-1125,125) F4(-1075,125) F5(-1025,125) F6(-975,125) F7(-925,125) F8(-875,125) F9(-825,125) F10(-775,125) F11(-725,125) F12(-675,125) F13(-625,125) F14(-575,125) F15(-525,125) F16(-475,125) F17(-425,125) F18(-375,125) F19(-325,125) F20(-275,125) F21(-225,125) F22(-175,125) F23(-125,125) F24(-75,125) F25(-25,125) F26(25,125) F27(75,125) F28(125,125) F29(175,125) F30(225,125) F31(275,125) F32(325,125) F33(375,125) F34(425,125) F35(475,125) F36(525,125) F37(575,125) F38(625,125) F39(675,125) F40(725,125) F41(775,125) F42(825,125) F43(875,125) F44(925,125) F45(975,125) F46(1025,125) F47(1075,125) F48(1125,125) F49(1175,125) F50(1225,125)
  round 40 hole 50 unplated mask+8: Z(-1320.5,0) Z(1320.5,120)
Top Layer:
  pour cut-out: -1225,150 -1229.97,150 -1239.16,146.19 -1246.19,139.16 -1250,129.97 -1250,125 -1250,-125 -1250,-129.97 -1246.19,-139.16 -1239.16,-146.19 -1229.97,-150 -1225,-150 1225,-150 1229.97,-150 1239.16,-146.19 1246.19,-139.16 1250,-129.97 1250,-125 1250,125 1250,129.97 1246.19,139.16 1239.16,146.19 1229.97,150 1225,150
Multi-Layer:
  pour cut-out: -1320.5,-40 -1324.44,-40 -1332.17,-38.46 -1339.45,-35.45 -1346,-31.07 -1351.57,-25.5 -1355.95,-18.95 -1358.96,-11.67 -1360.5,-3.94 -1360.5,0 -1360.5,3.94 -1358.96,11.67 -1355.95,18.95 -1351.57,25.5 -1346,31.07 -1339.45,35.45 -1332.17,38.46 -1324.44,40 -1320.5,40 -1316.56,40 -1308.83,38.46 -1301.55,35.45 -1295,31.07 -1289.43,25.5 -1285.05,18.95 -1282.04,11.67 -1280.5,3.94 -1280.5,0 -1280.5,-3.94 -1282.04,-11.67 -1285.05,-18.95 -1289.43,-25.5 -1295,-31.07 -1301.55,-35.45 -1308.83,-38.46 -1316.56,-40
  pour cut-out: 1320.5,80 1316.56,80 1308.83,81.54 1301.55,84.55 1295,88.93 1289.43,94.5 1285.05,101.05 1282.04,108.33 1280.5,116.06 1280.5,120 1280.5,123.94 1282.04,131.67 1285.05,138.95 1289.43,145.5 1295,151.07 1301.55,155.45 1308.83,158.46 1316.56,160 1320.5,160 1324.44,160 1332.17,158.46 1339.45,155.45 1346,151.07 1351.57,145.5 1355.95,138.95 1358.96,131.67 1360.5,123.94 1360.5,120 1360.5,116.06 1358.96,108.33 1355.95,101.05 1351.57,94.5 1346,88.93 1339.45,84.55 1332.17,81.54 1324.44,80
3D body "SEAM-50-11.0-L-06-2-A-K-TR.stp": height 571, standoff -54, extent -1348,-214 1348,214